# Altium footprint library Amirreza.PcbLib: 524 footprints (part 1 of 33)
Each footprint in its own frame and in the unit in brackets; x right, y up, seen from the top. Pads: shape width x height; smd on the part's side, far side on the other; paste and mask are expansions set on the pad; w line width, h text height; cw(c..) or ccw(c..) is an arc to the next point about the centre after c.
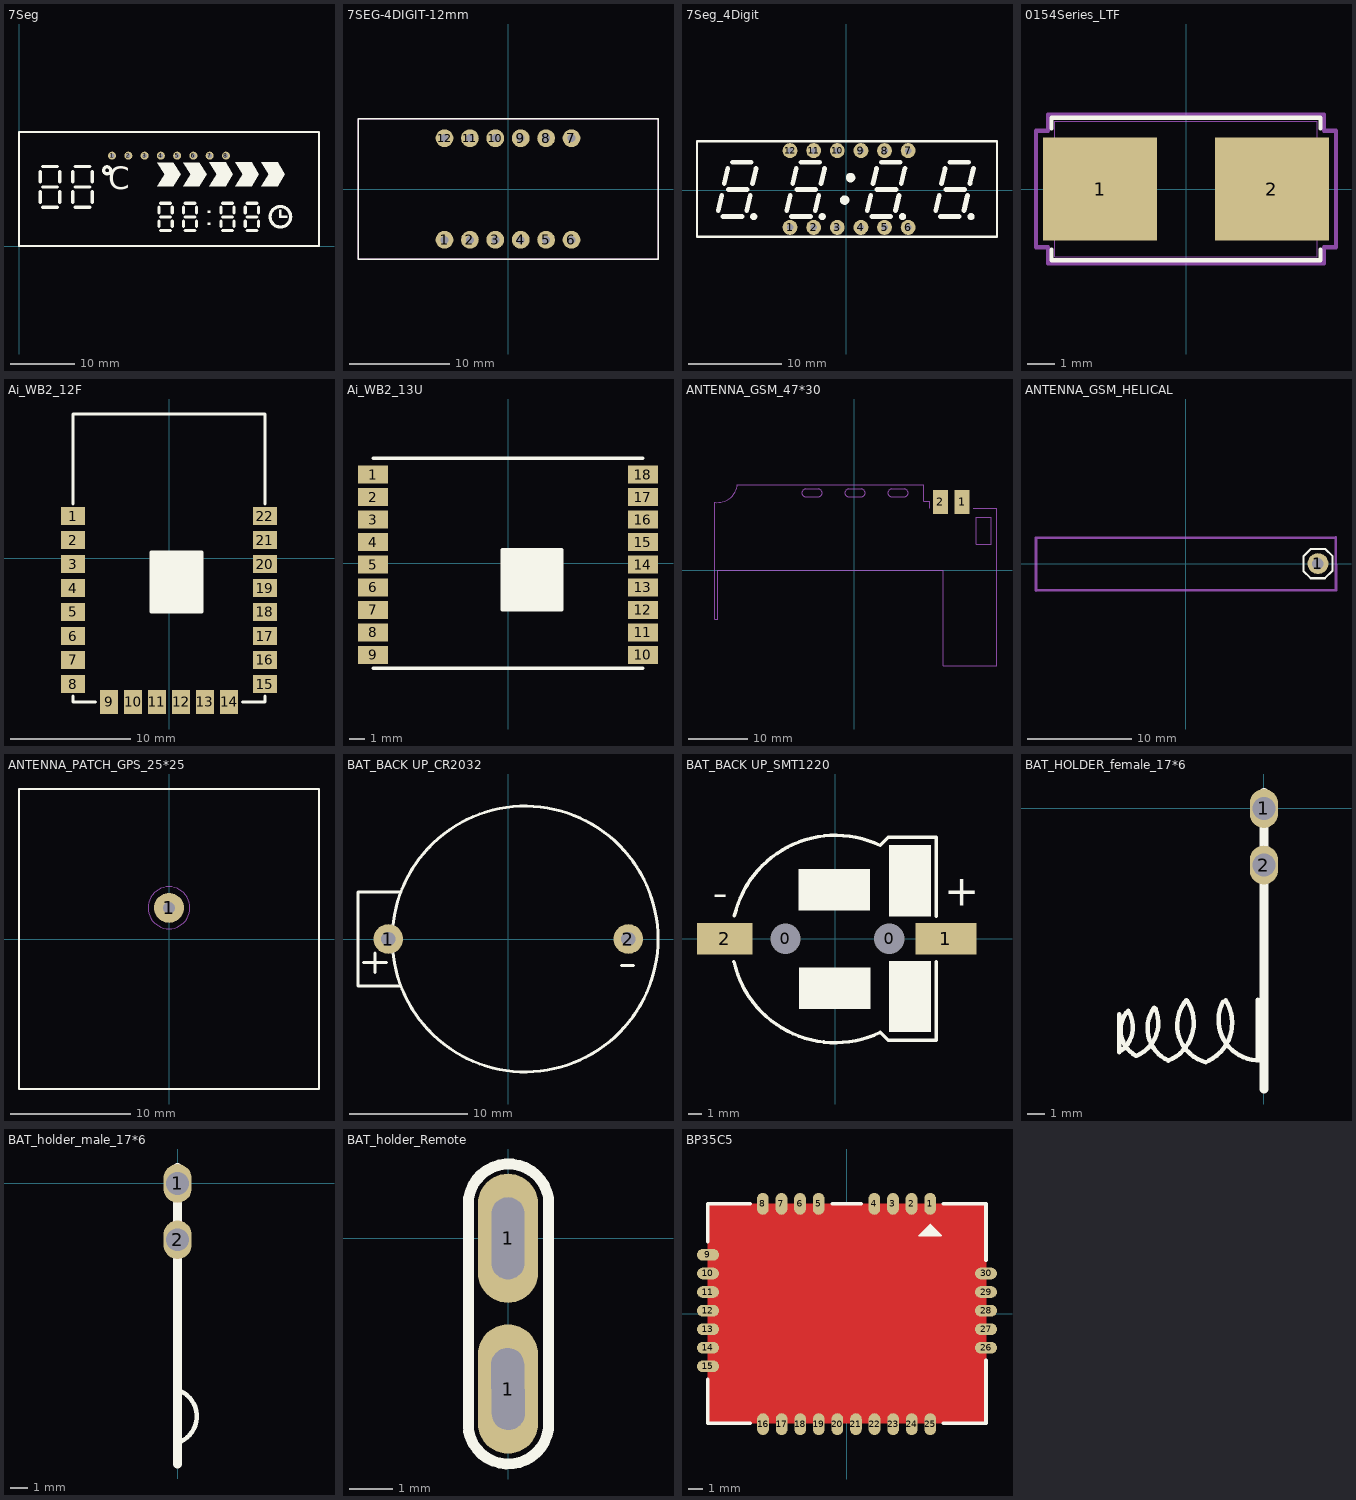
[diagram p0: the footprints below, top view; thin cyan lines are the x and y axes]

## 3D_HOME SECURITY_CASE [mm]
3D body "doorbox.STEP": height 54.6, standoff 31.1, extent -163.824,-79.746 113.176,137.754
3D body "AssemblyCaseAmaken.STEP": height 30.17, standoff -33.33, extent -163.824,-79.746 111.852,136.43

## 7Seg [mm]
pads (8):
  round 1.25 / inner round 1.25 / far side round 1.5 hole 0.7: 1(14.51,14.1) 2(17.05,14.1) 3(19.59,14.1) 4(22.13,14.1) 5(24.67,14.1) 6(27.21,14.1) 7(29.75,14.1) 8(32.29,14.1)
Top Overlay:
  circle w0.5: c40.779,4.565 r1.6
  circle w0.5: c13.741,11.811 r0.55
  region: 40.55,4.794 40.55,4.362 41.91,4.362 41.91,4.794
  rectangle: 40.55,4.362 40.982,5.715
  rectangle: 29.439,5.156 29.845,5.563
  rectangle: 29.439,3.289 29.845,3.696
  region: 21.567,13.018 24.092,13.018 25.235,11.163 24.092,9.309 21.567,9.309 22.71,11.163
  region: 25.629,13.03 28.154,13.03 29.297,11.176 28.154,9.322 25.629,9.322 26.772,11.176
  region: 29.691,13.043 32.216,13.043 33.359,11.189 32.216,9.335 29.691,9.335 30.834,11.189
  region: 33.753,13.056 36.278,13.056 37.421,11.201 36.278,9.347 33.753,9.347 34.896,11.201
  region: 37.815,13.068 40.34,13.068 41.483,11.214 40.34,9.36 37.815,9.36 38.958,11.214
  lines w0.254: 0,0 46.8,0 46.8,17.8 0,17.8 0,0
  lines w0.5: 3.302,6.807 3.302,8.458 ; 3.302,9.982 3.302,11.633 ; 3.683,6.045 5.969,6.045 ; 3.683,9.22 5.969,9.22 ; 3.683,12.395 5.969,12.395 ; 6.35,6.807 6.35,8.458 ; 6.35,9.982 6.35,11.633 ; 8.382,6.807 8.382,8.458 ; 8.382,9.982 8.382,11.633 ; 8.763,6.045 11.049,6.045 ; 8.763,9.22 11.049,9.22 ; 8.763,12.395 11.049,12.395 ; 11.43,6.807 11.43,8.458 ; 11.43,9.982 11.43,11.633 ; 21.844,3.048 21.844,3.912 ; 21.844,5.182 21.844,6.045 ; 22.098,2.413 23.622,2.413 ; 22.098,4.547 23.622,4.547 ; 22.098,6.68 23.622,6.68 ; 23.899,3.054 23.899,3.918 ; 23.899,5.175 23.899,6.039 ; 25.654,3.048 25.654,3.912 ; 25.654,5.182 25.654,6.045 ; 25.908,2.413 27.432,2.413 ; 25.908,4.547 27.432,4.547 ; 25.908,6.68 27.432,6.68 ; 27.709,3.054 27.709,3.918 ; 27.709,5.175 27.709,6.039 ; 31.496,3.048 31.496,3.912 ; 31.496,5.182 31.496,6.045 ; 31.75,2.413 33.274,2.413 ; 31.75,4.547 33.274,4.547 ; 31.75,6.68 33.274,6.68 ; 33.551,3.054 33.551,3.918 ; 33.551,5.175 33.551,6.039 ; 35.306,3.048 35.306,3.912 ; 35.306,5.182 35.306,6.045 ; 35.56,2.413 37.084,2.413 ; 35.56,4.547 37.084,4.547 ; 35.56,6.68 37.084,6.68 ; 37.361,3.054 37.361,3.918 ; 37.361,5.175 37.361,6.039
  text "C" at 13.943,7.707 h6

## 7SEG-4DIGIT-12mm [mil]
pads (12):
  round 70 hole 31.5: 1(-250,-200) 2(-150,-200) 3(-50,-200) 4(50,-200) 5(150,-200) 6(250,-200) 7(250,200) 8(150,200) 9(50,200) 10(-50,200) 11(-150,200) 12(-250,200)
Top Overlay:
  lines w5: -590.55,-275.59 590.55,-275.59 590.55,275.59 -590.55,275.59 -590.55,-275.59
Mechanical 13:
  lines w5: -590.55,-275.59 -590.55,275.59 590.55,275.59 590.55,-275.59 -590.55,-275.59
3D body "step_temp.STEP": height 283.46, standoff -240.16, extent -590.55,-275.59 590.55,275.59

## 7Seg_4Digit [mm]
pads (12):
  round 1.6 hole 0.7: 1(-6.02,-3.983) 2(-3.48,-3.983) 3(-0.94,-3.983) 4(1.6,-3.983) 5(4.14,-3.983) 6(6.68,-3.983) 7(6.68,4.267) 8(4.14,4.267) 9(1.6,4.267) 10(-0.94,4.267) 11(-3.48,4.267) 12(-6.02,4.267)
Top Overlay:
  circle w0.508: c-9.924,-2.824 r0.127
  circle w0.508: c-2.558,-2.824 r0.127
  circle w0.508: c6.078,-2.824 r0.127
  circle w0.508: c13.444,-2.824 r0.127
  circle w0.762: c-0.145,-1.046 r0.127
  circle w0.762: c0.49,1.367 r0.127
  lines w0.254: -16.02,-4.983 -16.02,5.267 16.23,5.267 16.23,-4.983 -16.02,-4.983
  lines w0.508: -13.734,-2.189 -13.353,-0.538 ; -13.226,-2.824 -11.194,-2.824 ; -13.099,0.732 -12.718,2.383 ; -12.661,0.082 -10.629,0.082 ; -12.21,3.018 -10.178,3.018 ; -10.686,-2.189 -10.305,-0.538 ; -10.051,0.732 -9.67,2.383 ; -6.368,-2.189 -5.987,-0.538 ; -5.86,-2.824 -3.828,-2.824 ; -5.733,0.732 -5.352,2.383 ; -5.295,0.082 -3.263,0.082 ; -4.844,3.018 -2.812,3.018 ; -3.32,-2.189 -2.939,-0.538 ; -2.685,0.732 -2.304,2.383 ; 2.268,-2.189 2.649,-0.538 ; 2.776,-2.824 4.808,-2.824 ; 2.903,0.732 3.284,2.383 ; 3.341,0.082 5.373,0.082 ; 3.792,3.018 5.824,3.018 ; 5.316,-2.189 5.697,-0.538 ; 5.951,0.732 6.332,2.383 ; 9.634,-2.189 10.015,-0.538 ; 10.142,-2.824 12.174,-2.824 ; 10.269,0.732 10.65,2.383 ; 10.707,0.082 12.739,0.082 ; 11.158,3.018 13.19,3.018 ; 12.682,-2.189 13.063,-0.538 ; 13.317,0.732 13.698,2.383
3D body "User Library-FYQ-2841A.STEP": height 5.8, standoff -6.7, extent -15.644,-5.202 16.456,4.898

## 0154Series_LTF [mil]
pads (2):
  rect 167x150 smd paste+0 mask+0: 1(-125.5,0) 2(125.5,0)
Top Overlay:
  lines w6: -196.5,-88.1 -196.5,-104 196.5,-104 196.5,-88.1 ; -196.5,88.1 -196.5,104 196.5,104 196.5,88.1
Mechanical 13:
  lines w1: -191.5,-99 191.5,-99 191.5,99 -191.5,99 -191.5,-99
  lines w6: -219,-85 -219,85 -201.5,85 -201.5,109 201.5,109 201.5,85 219,85 219,-85 201.5,-85 201.5,-109 -201.5,-109 -201.5,-85 -219,-85
3D body "User Library-OMNI-BLOK littelfuse.STEP": height 150, standoff 0, extent -193.5,-99.02 193.5,99.02

## Ai_WB2_12F [mm]
pads (22):
  rect 2x1.5 smd: 1(-8,3.5) 2(-8,1.5) 3(-8,-0.5) 4(-8,-2.5) 5(-8,-4.5) 6(-8,-6.5) 7(-8,-8.5) 8(-8,-10.5) 15(8,-10.5) 16(8,-8.5) 17(8,-6.5) 18(8,-4.5) 19(8,-2.5) 20(8,-0.5) 21(8,1.5) 22(8,3.5)
  rect 1.5x2 smd: 9(-5,-12) 10(-3,-12) 11(-1,-12) 12(1,-12) 13(3,-12) 14(5,-12)
Top Overlay:
  region: 2.75,0.5 -1.5,0.5 -1.5,-4.5 2.75,-4.5
  lines w0.254: -8,-11.492 -8,-12 -6.111,-12 ; -8,4.51 -8,12 8,12 8,4.51 ; 6.111,-12 8,-12 8,-11.492 ; -1.5,-4.5 -1.5,0.5 2.75,0.5 2.75,-4.5 -1.5,-4.5
3D body "User Library-ESP_12_E.STEP": height 2.75, standoff 0.04, extent -8,-12 8,12

## Ai_WB2_13U [mm]
pads (18):
  rect 2x1.2 smd: 1(-9,5.9) 2(-9,4.4) 3(-9,2.9) 4(-9,1.4) 5(-9,-0.1) 6(-9,-1.6) 7(-9,-3.1) 8(-9,-4.6) 9(-9,-6.1) 10(9,-6.1) 11(9,-4.6) 12(9,-3.1) 13(9,-1.6) 14(9,-0.1) 15(9,1.4) 16(9,2.9) 17(9,4.4) 18(9,5.9)
Top Overlay:
  rectangle: -0.4,-3.1 3.6,0.9
  lines w0.203: -9,-7 9,-7 ; -9,7 9,7 ; -0.4,-3.1 -0.4,0.9 3.6,0.9 3.6,-3.1 -0.4,-3.1
3D body "User Library-ESP-WROOM-02U.STEP": height 3.28, standoff 0.05, extent -9.035,-6.972 9.035,7.328

## ANTENNA_GSM_47*30 [mm]
pads (2):
  rect 2.5x4 smd: 1(18.055,11.486) 2(14.415,11.486)
Mechanical 13:
  lines w0.203: -23.335,11.4 -23.335,-8.2 -22.835,-8.2 -22.835,0 14.905,0 14.905,-16 23.905,-16 23.905,10.4 19.905,10.4 ; -23.329,11.4 ccw(c-22.954,14.775) -19.579,14.4 11.665,14.4 11.665,11.6 12.665,11.6 12.665,10.4 ; -8.181,12.351 cw(c-8.129,13.001) -8.181,13.651 -5.981,13.651 cw(c-6.033,13.001) -5.981,12.351 -8.181,12.351 ; -0.981,12.351 cw(c-0.929,13.001) -0.981,13.651 1.219,13.651 cw(c1.167,13.001) 1.219,12.351 -0.981,12.351 ; 6.219,12.351 cw(c6.271,13.001) 6.219,13.651 8.419,13.651 cw(c8.367,13.001) 8.419,12.351 6.219,12.351 ; 20.406,4.39 22.906,4.39 22.906,8.89 20.406,8.89 20.406,4.39
3D body "ModelSaziAnten-SheetMetal.STEP": height 5.01, standoff -4.72, extent -23.518,-13.091 24.074,14.4

## ANTENNA_GSM_HELICAL [mm] "HELICAL_5*27MM GSM ANTENNA"
pads (1):
  round 2 / inner round 2 / far side round 2.4 hole 1.1: 1(12.643,0.034)
Top Overlay:
  lines w0.2: 11.243,-0.67 11.939,-1.366 13.299,-1.366 14.043,-0.622 14.043,0.73 13.339,1.434 11.958,1.434 11.243,0.719 11.243,-0.67
Mechanical 1:
  lines w0.254: 14.345,-2.511 -14.357,-2.536 -14.357,2.509 14.345,2.534 14.37,-2.511
3D body "User Library-Spring GSM Antenna.STEP": height 5.99, standoff -2.2, extent -10.948,-2.458 13.04,2.526

## ANTENNA_PATCH_GPS_25*25 [mm]
pads (1):
  round 2.5 hole 1: 1(0,2.6)
Top Overlay:
  lines w0.203: -12.5,-12.5 12.5,-12.5 12.5,12.5 -12.5,12.5 -12.5,-12.5
Mechanical 13:
  circle w0.05: c0,2.6 r1.75
3D body "User Library-CGGP_25_A.step": height 4.05, standoff -1.9, extent -12.55,-12.55 12.55,12.55

## BAT_BACK UP_CR2032 [mm]
pads (2):
  round 2.5 hole 1.2: 1(-10.16,0) 2(10.16,0)
Top Overlay:
  circle w0.254: c1.422,0 r11.25
  lines w0.254: -12.246,-1.998 -10.296,-1.998 ; -11.296,-2.848 -11.296,-1.198 ; -9.128,-4 -12.728,-4 -12.728,4 -9.078,4 ; 9.59,-2.25 10.59,-2.25
3D body "User Library-CR2032_HOR_HOLD.step": height 8.53, standoff -3.97, extent -12.078,-10.924 12.422,11.076

## BAT_BACK UP_SMT1220 [mm]
pads (4):
  round 1.524 hole 2.2: 0(-3.6,0) 0(3.9,0)
  rect 4.4x2.3 smd: 1(8,0)
  rect 4x2.3 smd: 2(-8,0)
Top Overlay:
  region: 2.54,-5.066 2.54,-2.057 -2.616,-2.057 -2.616,-5.066
  region: 2.515,2.046 2.515,5.055 -2.641,5.055 -2.641,2.046
  rectangle: 3.9,-6.756 6.909,-1.6
  rectangle: 3.9,1.626 6.909,6.782
  lines w0.254: -7.326,-1.652 ccw(c0,0) 3.237,-6.777 ; -7.293,1.66 cw(c0.025,-0.025) 3.251,6.756 3.835,7.341 4.572,7.341 7.29,7.341 7.29,1.644 ; 3.254,-6.759 3.835,-7.341 4.572,-7.341 7.29,-7.341 7.29,-1.644
  text "-" at -8.874,1.575 h3.81
  text "+" at 7.89,1.626 h3.81
3D body "User Library-CR1220-2.STEP": height 3, standoff 1, extent -6.2,-6.2 6.2,6.2
3D body "User Library-s8411-45r_asm.STEP": height 4.25, standoff -1, extent -9.5,-7.374 9.701,7.374

## BAT_HOLDER_female_17*6 [mm]
pads (2):
  oval 1.6x2.2 hole 1.3: 1(0,0) 2(0,-3.2)
Top Overlay:
  lines w0.254: -8.179,-11.633 -8.179,-13.767 ccw(c-9.093,-12.344) -7.671,-11.43 ; -7.772,-11.532 ccw(c-6.442,-12.515) -7.21,-13.98 ccw(c-7.991,-12.11) -6.121,-11.328 ; -6.2,-11.254 ccw(c-4.572,-12.421) -5.395,-14.246 ccw(c-6.277,-12.109) -4.332,-10.86 ; -4.374,-10.824 ccw(c-2.728,-12.238) -3.274,-14.338 ; -3.124,-14.249 ccw(c-4.166,-12.116) -2.169,-10.832 ; -2.312,-10.91 ccw(c-0.292,-11.951) -0.192,-14.22 ; -0.356,-14.224 -0.356,-10.795
  lines w0.5: 0,-15.85 0,0.914

## BAT_holder_male_17*6 [mm]
pads (2):
  oval 1.6x2.2 hole 1.3: 1(0,0) 2(0,-3.2)
Top Overlay:
  lines w0.254: -0.025,-14.732 ccw(c-0.487,-13.221) -0.025,-11.709
  lines w0.5: 0,-15.926 0,0.914

## BAT_holder_Remote [mm]
pads (2):
  oval 1.4x3 hole 0.762 slot 1.9 at 90.7 deg: 1(0,-3.5)
  oval 1.4x3 hole 0.762 slot 1.9 at 90 deg: 1(0,0)
Top Overlay:
  lines w0.254: -0.921,-4.394 -0.921,0.889 ; -0.917,-4.471 ccw(c0.007,-4.3) 0.94,-4.42 ; -0.914,0.94 cw(c0.013,0.785) 0.944,0.915 ; 0.945,-4.369 0.945,0.864

## BP35C5 [mm] "ROHM Wi-Sun Module_3.3V_47mA (20mW)"
pads (30):
  oval 0.8x1.5 smd: 1(5.685,7.5) 2(4.415,7.5) 3(3.145,7.5) 4(1.875,7.5) 5(-1.935,7.5) 6(-3.205,7.5) 7(-4.475,7.5) 8(-5.745,7.5) 16(-5.735,-7.56) 17(-4.465,-7.56) 18(-3.195,-7.56) 19(-1.925,-7.56) 20(-0.655,-7.56) 21(0.615,-7.56) 22(1.885,-7.56) 23(3.155,-7.56) 24(4.425,-7.56) 25(5.695,-7.56)
  oval 1.5x0.8 smd: 9(-9.497,4.01) 10(-9.497,2.74) 11(-9.497,1.47) 12(-9.497,0.2) 13(-9.497,-1.07) 14(-9.497,-2.34) 15(-9.497,-3.61) 26(9.505,-2.34) 27(9.505,-1.07) 28(9.505,0.2) 29(9.505,1.47) 30(9.505,2.74)
Top Layer:
  pour cut-out: -9.505,7.5 -9.495,7.49 9.505,7.49 9.505,-7.5 -9.505,-7.5
Top Overlay:
  lines w0.127: 5.009,5.392 6.381,5.392 ; 5.085,5.468 6.304,5.468 ; 5.161,5.544 6.228,5.544 ; 5.238,5.62 6.152,5.62 ; 5.314,5.697 6.076,5.697 ; 5.39,5.773 6,5.773 ; 5.466,5.849 5.923,5.849 ; 5.542,5.925 5.847,5.925 ; 5.619,6.001 5.771,6.001 ; 4.933,5.316 6.431,5.316 5.695,6.078 4.933,5.316
  lines w0.254: -9.505,-4.5 -9.505,-7.5 -6.605,-7.5 ; -9.505,4.9 -9.505,7.5 -6.605,7.5 ; -1.013,7.5 0.967,7.5 ; 6.605,-7.5 9.505,-7.5 9.505,-3.2 ; 6.605,7.5 9.505,7.5 ; 9.505,3.64 9.505,7.49
3D body "User Library-ROHM BP35C5.STEP": height 2.52, standoff 0, extent -9.525,-7.5 9.505,7.515